# Altium footprint library lib_datalogger.PcbLib: 866 footprints (part 15 of 55)
Each footprint in its own frame and in the unit in brackets; x right, y up, seen from the top. Pads: shape width x height; smd on the part's side, far side on the other; paste and mask are expansions set on the pad; w line width, h text height; cw(c..) or ccw(c..) is an arc to the next point about the centre after c.
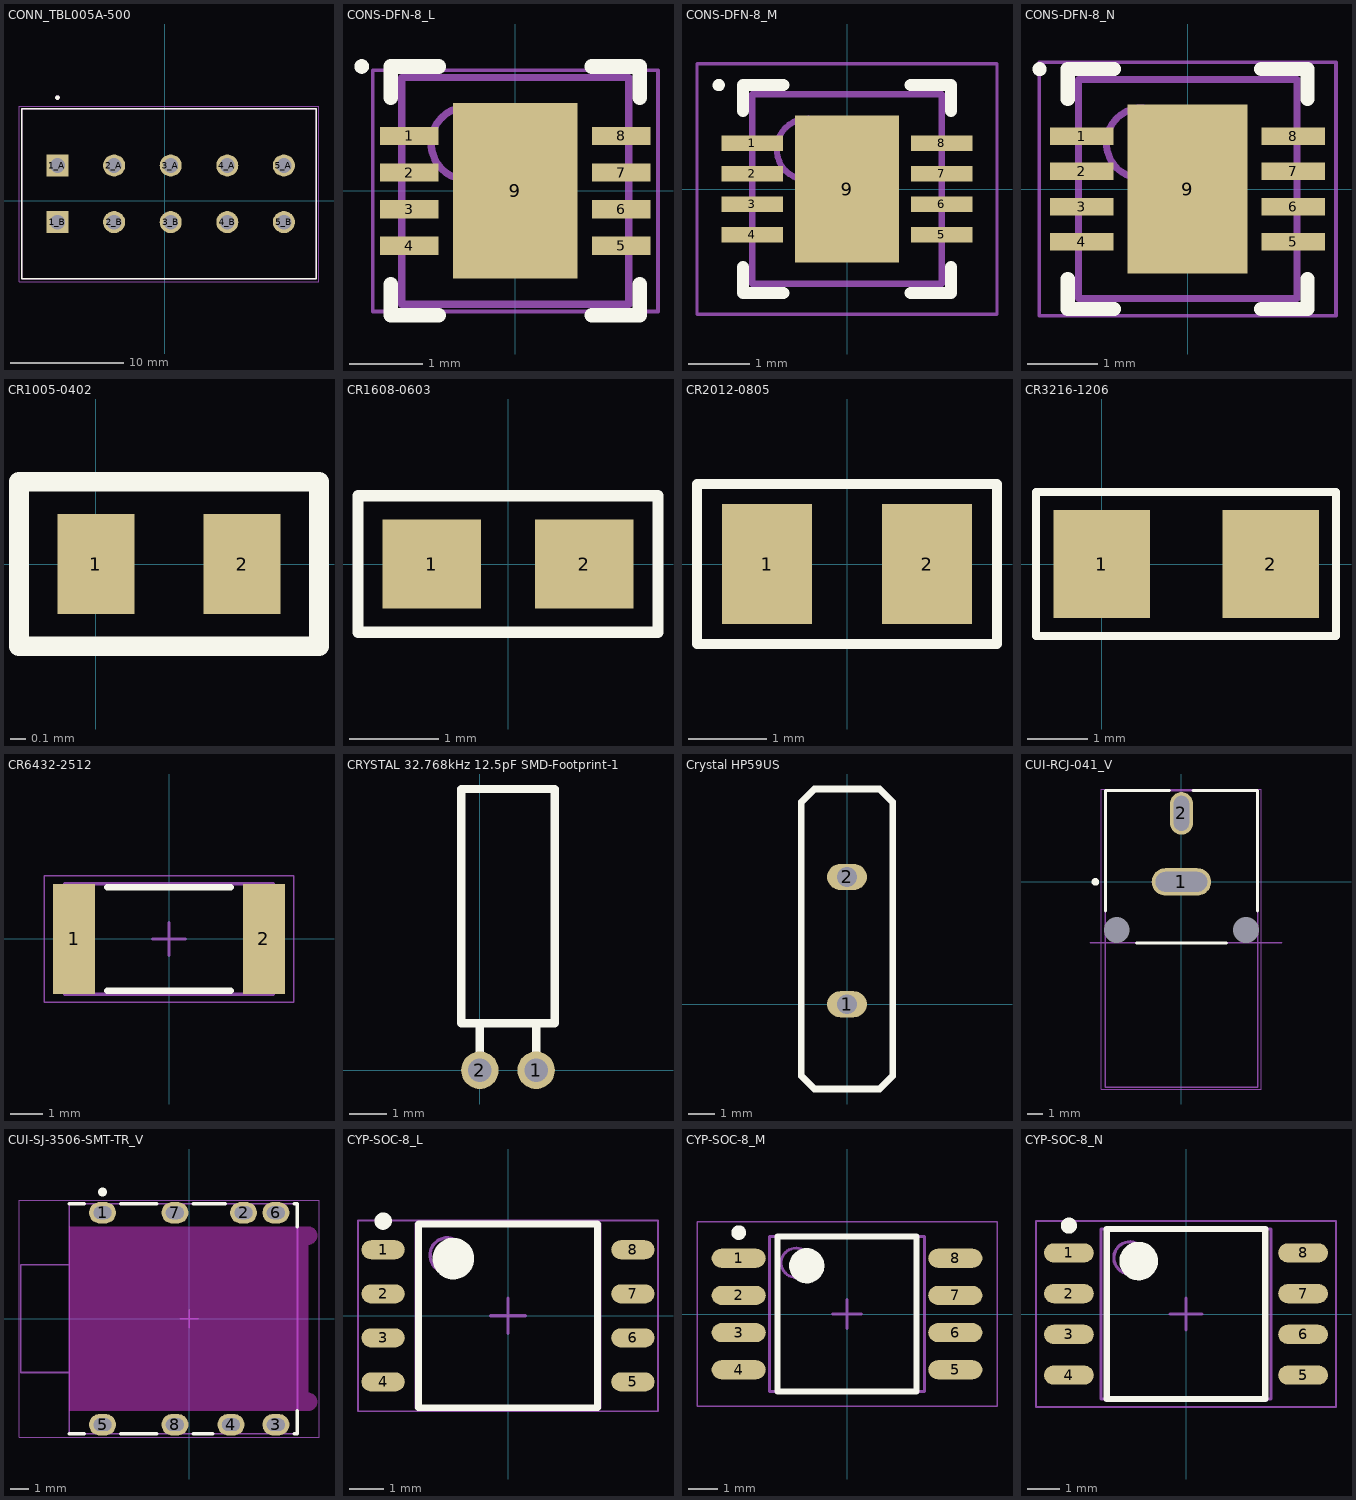
[diagram p14: the footprints below, top view; thin cyan lines are the x and y axes]

## CONN_TBL005A-500 [mm]
pads (10):
  rect 1.95x1.95 hole 1.3: 1_A(-9.456,3.091) 1_B(-9.456,-1.909)
  round 1.95 hole 1.3: 2_A(-4.456,3.091) 2_B(-4.456,-1.909) 3_A(0.544,3.091) 3_B(0.544,-1.909) 4_A(5.544,3.091) 4_B(5.544,-1.909) 5_A(10.544,3.091) 5_B(10.544,-1.909)
Top Overlay:
  circle w0.2: c-9.456,9.091 r0.1
  lines w0.127: -12.606,-6.909 13.394,-6.909 13.394,8.091 -12.606,8.091 -12.606,-6.909
Mechanical 13:
  circle w0.2: c-9.456,9.091 r0.1
  lines w0.127: -12.606,-6.909 13.394,-6.909 13.394,8.091 -12.606,8.091 -12.606,-6.909
Mechanical 15:
  lines w0.05: -12.856,-7.159 -12.856,8.341 13.644,8.341 13.644,-7.159 -12.856,-7.159
3D body "CUI_DEVICES_TBL005A-500-05GY-2BE.step": height 16.37, standoff -4, extent -13.175,-7.102 14.775,8.9

## CONS-DFN-8_L [mm] "SON, 8-Leads, Body 3.10x3.10mm, Pitch 0.50mm, Thermal Pad 2.40x1.7mm, IPC High Density"
height 0.9
pads (9):
  rect 0.8x0.25 smd: 1(-1.45,0.75) 2(-1.45,0.25) 3(-1.45,-0.25) 4(-1.45,-0.75) 5(1.45,-0.75) 6(1.45,-0.25) 7(1.45,0.25) 8(1.45,0.75)
  rect 1.7x2.4 smd: 9(0,0)
Top Overlay:
  circle w0.1: c-2.1,1.7 r0.05
  lines w0.2: -1.7,-1.275 -1.7,-1.7 -1.045,-1.7 ; -1.7,1.275 -1.7,1.7 -1.045,1.7 ; 1.045,-1.7 1.7,-1.7 1.7,-1.275 ; 1.045,1.7 1.7,1.7 1.7,1.275
Mechanical 13:
  circle w0.1: c-0.65,0.65 r0.5
  lines w0.1: -1.55,-1.55 -1.55,1.55 1.55,1.55 1.55,-1.55 -1.55,-1.55
Mechanical 15:
  lines w0.05: -1.95,-1.65 1.95,-1.65 1.95,1.65 -1.95,1.65 -1.95,-1.65
  lines w0.1: -0.5,0 0.5,0 ; 0,-0.5 0,0.5
3D body "SON50P300X90_HS-9L.step": height 0.9, standoff 0, extent -1.55,-1.55 1.55,1.55

## CONS-DFN-8_M [mm] "SON, 8-Leads, Body 3.1x3.1mm, Pitch 0.5mm, Thermal Pad 2.4x1.7mm, IPC Low Density"
height 0.9
pads (9):
  rect 1x0.25 smd: 1(-1.55,0.75) 2(-1.55,0.25) 3(-1.55,-0.25) 4(-1.55,-0.75) 5(1.55,-0.75) 6(1.55,-0.25) 7(1.55,0.25) 8(1.55,0.75)
  rect 1.7x2.4 smd: 9(0,0)
Top Overlay:
  circle w0.1: c-2.1,1.7 r0.05
  lines w0.2: -1.7,-1.275 -1.7,-1.7 -1.045,-1.7 ; -1.7,1.275 -1.7,1.7 -1.045,1.7 ; 1.045,-1.7 1.7,-1.7 1.7,-1.275 ; 1.045,1.7 1.7,1.7 1.7,1.275
Mechanical 13:
  circle w0.1: c-0.65,0.65 r0.5
  lines w0.1: -1.55,-1.55 -1.55,1.55 1.55,1.55 1.55,-1.55 -1.55,-1.55
Mechanical 15:
  lines w0.05: -2.455,-2.05 -2.455,2.05 2.455,2.05 2.455,-2.05 -2.455,-2.05
  lines w0.1: -0.5,0 0.5,0 ; 0,-0.5 0,0.5
3D body "SON50P300X90_HS-9M.step": height 0.9, standoff 0, extent -1.55,-1.55 1.55,1.55

## CONS-DFN-8_N [mm] "SON, 8-Leads, Body 3.1x3.1mm, Pitch 0.5mm, Thermal Pad 2.4x1.7mm, IPC Medium Density"
height 0.9
pads (9):
  rect 0.9x0.25 smd: 1(-1.5,0.75) 2(-1.5,0.25) 3(-1.5,-0.25) 4(-1.5,-0.75) 5(1.5,-0.75) 6(1.5,-0.25) 7(1.5,0.25) 8(1.5,0.75)
  rect 1.7x2.4 smd: 9(0,0)
Top Overlay:
  circle w0.1: c-2.1,1.7 r0.05
  lines w0.2: -1.7,-1.275 -1.7,-1.7 -1.045,-1.7 ; -1.7,1.275 -1.7,1.7 -1.045,1.7 ; 1.045,-1.7 1.7,-1.7 1.7,-1.275 ; 1.045,1.7 1.7,1.7 1.7,1.275
Mechanical 13:
  circle w0.1: c-0.65,0.65 r0.5
  lines w0.1: -1.55,-1.55 1.55,-1.55 1.55,1.55 -1.55,1.55 -1.55,-1.55
Mechanical 15:
  lines w0.05: -2.105,-1.8 2.105,-1.8 2.105,1.8 -2.105,1.8 -2.105,-1.8
  lines w0.1: -0.5,0 0.5,0 ; 0,-0.5 0,0.5
3D body "SON50P300X90_HS-9N.step": height 0.9, standoff 0, extent -1.55,-1.55 1.55,1.55

## CR1005-0402 [mm]
pads (2):
  rect 0.5x0.65 smd: 1(0,0) 2(0.95,0)
Top Overlay:
  lines w0.127: -0.5,-0.533 -0.5,0.533 1.45,0.533 1.45,-0.533 -0.5,-0.533
3D body "User Library-RESC1005X04N.step": height 0.35, standoff 0, extent -0.025,-0.25 0.975,0.25

## CR1608-0603 [mm] "Chip Resistor; Body 1.6 x 0.8 mm (LxW typ)"
height 1.35
pads (2):
  rect 1.1x1 smd: 1(-0.85,0) 2(0.85,0)
Top Overlay:
  lines w0.127: -1.676,-0.762 1.676,-0.762 1.676,0.762 -1.676,0.762 -1.676,-0.762
3D body "User Library-RESC1608X05N.step": height 0.45, standoff 0, extent -0.775,-0.425 0.775,0.425

## CR2012-0805 [mil] "Chip Capacitor"
pads (2):
  rect 45x60 smd: 1(-40,0) 2(40,0)
Top Overlay:
  lines w5: -75,-40 -75,40 75,40 75,-40 -75,-40
3D body "RESC2012X05N.step": height 17.76, standoff 0, extent -39.37,-24.61 39.37,24.61

## CR3216-1206 [mm] "Chip Capacitor; Body 3.2 x 1.6 mm (LxW typ)"
height 1.35
pads (2):
  rect 1.6x1.8 smd: 1(0,0) 2(2.8,0)
Top Overlay:
  lines w0.127: -1.092,-1.194 3.886,-1.194 3.886,1.194 -1.092,1.194 -1.092,-1.194
3D body "User Library-RESC3216X06N.step": height 0.55, standoff 0, extent -0.203,-0.8 2.997,0.8

## CR6432-2512 [mm] "Chip Resistor, 2-Leads, Body 6,35x3,20mm, IPC Medium Density"
height 0.65
pads (2):
  rect 1.3x3.4 smd: 1(-2.925,0) 2(2.925,0)
Top Overlay:
  lines w0.2: -1.9,-1.6 1.9,-1.6 ; -1.9,1.6 1.9,1.6
Mechanical 13:
  lines w0.1: -3.225,-1.7 -3.225,1.7 3.225,1.7 3.225,-1.7 -3.225,-1.7
Mechanical 15:
  lines w0.05: -3.85,-1.95 -3.85,1.95 3.85,1.95 3.85,-1.95 -3.85,-1.95
  lines w0.1: -0.5,0 0.5,0 ; 0,-0.5 0,0.5
3D body "CR6432-2512_2.step": height 0.65, standoff 0, extent -3.225,-1.7 3.225,1.7

## CRYSTAL 32.768kHz 12.5pF SMD-Footprint-1 [mil]
pads (2):
  round 40 hole 25: 1(60,0) 2(0,0)
Top Overlay:
  lines w9: 0,0 0,50 ; 60,0 60,50 ; -20,50 80,50 80,300 -20,300 -20,50
3D body "User Library-DT-26-1.step": height 109.37, standoff -48.11, extent -9.37,-4.88 69.37,276.22

## Crystal HP59US [mil]
pads (2):
  oval 60x39.37 hole 30: 1(0,0) 2(0,192.13)
Top Overlay:
  lines w10: -68.9,-108.27 -68.9,305.12 -49.21,324.8 49.21,324.8 68.9,305.12 68.9,-108.27 49.21,-127.95 -49.21,-127.95 -68.9,-108.27
3D body "Crystal-HP49US.STEP": height 177.17, standoff -118.11, extent -88.58,-125 94.49,321.85

## CUI-RCJ-041_V [mm] "Jack, 2-Leads, Body 19.5x10mm"
height 11.724
pads (4):
  oval 3.9x1.8 hole 1.3 slot 3.4 at 0 deg: 1(0,0)
  oval 1.5x2.8 hole 1 slot 2.3 at 90 deg: 2(0,4.5)
  round 0 hole 1.7 square unplated: MH1(-4.25,-3.15) MH2(4.25,-3.15)
Top Overlay:
  circle w0.25: c-5.65,0 r0.125
  lines w0.2: -5,-1.9 -5,6 -0.775,6 ; -2.95,-4 2.95,-4 ; 0.775,6 5,6 5,-1.9
Mechanical 1:
  lines w0.1: -6,-4 6.6,-4
  text "PCB Edge" at 6,-3.8 h0.6
Mechanical 13:
  lines w0.1: -5,-13.5 -5,6 5,6 5,-13.5 -5,-13.5
Mechanical 15:
  lines w0.05: -5.25,-13.6 -5.25,6.1 5.25,6.1 5.25,-13.6 -5.25,-13.6
  lines w0.1: -0.5,0 0.5,0 ; 0,-0.5 0,0.5
3D body "rcj-041.stp": height 11.51, standoff -3.98, extent -5,-13.5 5,6

## CUI-SJ-3506-SMT-TR_V [mm] "Jack, 6-Leads, Body 15.4x12.8mm"
height 4.7
pads (8):
  oval 1.5x1.2 hole 0.7 slot 1 at 0 deg unplated paste-1: 1(-4.825,5.9) 2(3.025,5.9) 3(4.825,-5.9) 4(2.325,-5.9) 5(-4.825,-5.9) 6(4.825,5.9) 7(-0.795,5.9) 8(-0.795,-5.9)
Top Overlay:
  circle w0.25: c-4.825,7.05 r0.125
  lines w0.2: -6.675,-6.4 -5.841,-6.4 ; -6.675,6.4 -5.841,6.4 ; -3.809,-6.4 -1.811,-6.4 ; -3.809,6.4 -1.811,6.4 ; 0.221,-6.4 1.309,-6.4 ; 0.221,6.4 2.009,6.4 ; 5.841,-6.4 6.025,-6.4 6.025,-5.125 ; 5.841,6.4 6.025,6.4 6.025,5.125
Keep-Out Layer:
  board cut-out: -6.675,5.125 6.625,5.125 6.671,5.123 6.716,5.117 6.76,5.106 6.803,5.092 6.846,5.074 6.886,5.052 6.924,5.026 6.959,4.997 6.98,4.977 6.999,4.957 7.034,4.913 7.062,4.867 7.085,4.821 7.103,4.773 7.115,4.724 7.123,4.675 7.125,4.625 7.123,4.581 7.117,4.537 7.107,4.493 7.094,4.45 7.076,4.408 7.054,4.369 7.042,4.349 7.029,4.33 7.001,4.295 6.983,4.276 6.964,4.258 6.944,4.24 6.923,4.224 6.902,4.209 6.88,4.195 6.833,4.17 6.808,4.16 6.783,4.15 6.757,4.143 6.731,4.136 6.705,4.131 6.678,4.128 6.652,4.126 6.625,4.125 6.625,-4.125 6.65,-4.126 6.674,-4.127 6.723,-4.135 6.772,-4.147 6.817,-4.163 6.863,-4.185 6.907,-4.212 6.947,-4.242 6.983,-4.275 7.017,-4.314 7.046,-4.355 7.071,-4.398 7.081,-4.421 7.091,-4.443 7.099,-4.465 7.106,-4.488 7.117,-4.534 7.123,-4.581 7.125,-4.625 7.123,-4.671 7.117,-4.717 7.106,-4.762 7.092,-4.805 7.072,-4.849 7.06,-4.871 7.047,-4.892 7.034,-4.912 7.02,-4.932 6.989,-4.968 6.971,-4.986 6.952,-5.004 6.933,-5.019 6.912,-5.035 6.891,-5.049 6.869,-5.061 6.847,-5.073 6.824,-5.084 6.801,-5.093 6.777,-5.101 6.752,-5.109 6.727,-5.115 6.702,-5.119 6.677,-5.122 6.651,-5.124 6.625,-5.125 -6.675,-5.125
Mechanical 13:
  lines w0.1: -6.675,-3 -9.375,-3 -9.375,3 -6.675,3 ; -6.675,-6.4 6.025,-6.4 6.025,6.4 -6.675,6.4 -6.675,-6.4
Mechanical 15:
  lines w0.05: -9.475,-6.6 -9.475,6.6 7.225,6.6 7.225,-6.6 -9.475,-6.6
  lines w0.1: -0.5,0 0.5,0 ; 0,-0.5 0,0.5
3D body "sj-3506-smt.stp": height 3.26, standoff -2.74, extent -9.375,-6.4 6.025,6.4

## CYP-SOC-8_L [mm] "SOIC, 8-Leads, Body 5.3x5.3mm, Pitch 1.27mm, IPC High Density"
height 2.16
pads (8):
  oval 1.25x0.55 smd: 1(-3.6,1.905) 2(-3.6,0.635) 3(-3.6,-0.635) 4(-3.6,-1.905) 5(3.6,-1.905) 6(3.6,-0.635) 7(3.6,0.635) 8(3.6,1.905)
Top Overlay:
  circle w0.25: c-3.6,2.73 r0.125
  circle w0.6: c-1.575,1.65 r0.3
  lines w0.2: -2.575,-2.65 -2.575,2.65 2.575,2.65 2.575,-2.65 -2.575,-2.65
Mechanical 13:
  circle w0.1: c-1.75,1.75 r0.5
  lines w0.1: -2.65,-2.65 -2.65,2.65 2.65,2.65 2.65,-2.65 -2.65,-2.65
Mechanical 15:
  lines w0.05: -4.325,-2.75 -4.325,2.75 4.325,2.75 4.325,-2.75 -4.325,-2.75
  lines w0.1: -0.5,0 0.5,0 ; 0,-0.5 0,0.5
3D body "SOIC127P800X216-8L.step": height 2.16, standoff 0, extent -4,-2.65 4,2.65

## CYP-SOC-8_M [mm] "SOIC, 8-Leads, Body 5.3x5.3mm, Pitch 1.27mm, IPC Low Density"
height 2.16
pads (8):
  oval 1.85x0.65 smd: 1(-3.7,1.905) 2(-3.7,0.635) 3(-3.7,-0.635) 4(-3.7,-1.905) 5(3.7,-1.905) 6(3.7,-0.635) 7(3.7,0.635) 8(3.7,1.905)
Top Overlay:
  circle w0.25: c-3.7,2.78 r0.125
  circle w0.6: c-1.375,1.65 r0.3
  lines w0.2: -2.375,-2.65 -2.375,2.65 2.375,2.65 2.375,-2.65 -2.375,-2.65
Mechanical 13:
  circle w0.1: c-1.75,1.75 r0.5
  lines w0.1: -2.65,-2.65 -2.65,2.65 2.65,2.65 2.65,-2.65 -2.65,-2.65
Mechanical 15:
  lines w0.05: -5.125,-3.15 -5.125,3.15 5.125,3.15 5.125,-3.15 -5.125,-3.15
  lines w0.1: -0.5,0 0.5,0 ; 0,-0.5 0,0.5
3D body "SOIC127P800X216-8M.step": height 2.16, standoff 0, extent -4,-2.65 4,2.65

## CYP-SOC-8_N [mm] "SOIC, 8-Leads, Body 5.3x5.3mm, Pitch 1.27mm, IPC Medium Density"
height 2.16
pads (8):
  oval 1.55x0.6 smd: 1(-3.65,1.905) 2(-3.65,0.635) 3(-3.65,-0.635) 4(-3.65,-1.905) 5(3.65,-1.905) 6(3.65,-0.635) 7(3.65,0.635) 8(3.65,1.905)
Top Overlay:
  circle w0.25: c-3.65,2.755 r0.125
  circle w0.6: c-1.475,1.65 r0.3
  lines w0.2: -2.475,-2.65 -2.475,2.65 2.475,2.65 2.475,-2.65 -2.475,-2.65
Mechanical 13:
  circle w0.1: c-1.75,1.75 r0.5
  lines w0.1: -2.65,-2.65 -2.65,2.65 2.65,2.65 2.65,-2.65 -2.65,-2.65
Mechanical 15:
  lines w0.05: -4.675,-2.9 -4.675,2.9 4.675,2.9 4.675,-2.9 -4.675,-2.9
  lines w0.1: -0.5,0 0.5,0 ; 0,-0.5 0,0.5
3D body "SOIC127P800X216-8N.step": height 2.16, standoff 0, extent -4,-2.65 4,2.65